# Altium footprint library Display.PcbLib: 9 footprints
Each footprint in its own frame and in the unit in brackets; x right, y up, seen from the top. Pads: shape width x height; smd on the part's side, far side on the other; paste and mask are expansions set on the pad; w line width, h text height; cw(c..) or ccw(c..) is an arc to the next point about the centre after c.
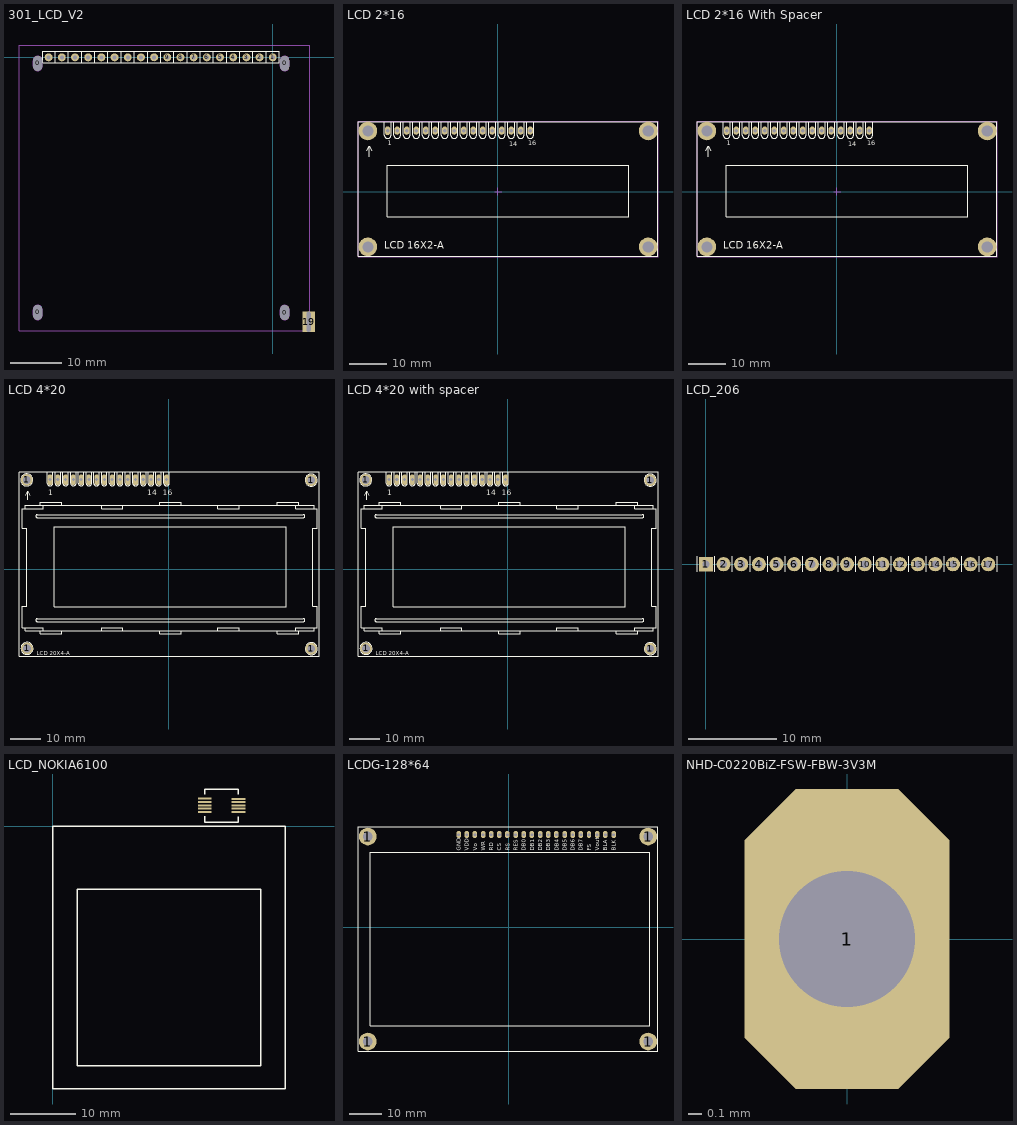
[diagram p0: the footprints below, top view; thin cyan lines are the x and y axes]

## 301_LCD_V2 [mil]
pads (23):
  oval 66.93x110.24 hole 66.93 slot 110.24 at 90 deg unplated: 0(-1781.37,-1933.04) 0(-1781.37,-46.33) 0(89.89,-46.43) 0(90.09,-1933.83)
  round 60 hole 30: 1(0,0) 2(-100.01,0) 3(-199.53,0) 4(-299.54,0) 5(-399.55,0) 6(-499.57,0) 7(-599.58,0) 8(-699.1,0) 9(-799.11,0) 10(-899.22,0.1) 11(-999.07,-0.17) 12(-1098.7,0) 13(-1198.7,0) 14(-1298.7,0) 15(-1398.7,0) 16(-1498.7,0) 17(-1598.7,0) 18(-1698.7,0)
  rect 94.49x157.48 hole 31.5 slot 149.61 at 90 deg: 19(271.54,-2004.36)
Top Overlay:
  lines w7.87: -1648.7,-41 -1648.7,44 ; -1548.7,-41 -1548.7,44 ; -1448.7,-41 -1448.7,44 ; -1348.7,-41 -1348.7,44 ; -1248.7,-41 -1248.7,44 ; -1148.7,-41 -1148.7,44 ; -1049.07,-41.17 -1049.07,43.83 ; -949.22,-40.9 -949.22,44.1 ; -849.11,-41 -849.11,44 ; -749.1,-41 -749.1,44 ; -649.58,-41 -649.58,44 ; -549.57,-41 -549.57,44 ; -449.55,-41 -449.55,44 ; -349.54,-41 -349.54,44 ; -249.53,-41 -249.53,44 ; -150.01,-41 -150.01,44 ; -50,-41 -50,44 ; 49,45 -1742,45 -1742,24 -1742,-42 50.52,-42 50.52,45
Bottom Overlay:
  drawing of 154 lines, arcs and shapes, not listed
Mechanical 1:
  circle w7.87: c-1698.71,0 r15
  circle w7.87: c-1598.71,0 r15
  circle w7.87: c-1498.71,0 r15
  circle w7.87: c-1398.71,0 r15
  circle w7.87: c-1298.71,0 r15
  circle w7.87: c-1198.71,0 r15
  circle w7.87: c-1099.08,-0.17 r15
  circle w7.87: c-999.23,0.1 r15
  circle w7.87: c-899.12,0 r15
  circle w7.87: c-799.11,0 r15
  circle w7.87: c-699.59,0 r15
  circle w7.87: c-599.58,0 r15
  circle w7.87: c-499.57,0 r15
  circle w7.87: c-399.55,0 r15
  circle w7.87: c-299.54,0 r15
  circle w7.87: c-200.02,0 r15
  circle w7.87: c-100.01,0 r15
  circle w7.87: c0,0 r15
  lines w7.87: 264,-2071 -1922.95,-2071 ; 281.38,-2004.36 281.38,-1906.38 281.38,90.92 -1922.95,90.92 -1922.95,-2071 ; -1922.95,-2071 -1922.95,-2071 ; -1814.83,-1954.69 ccw(c-1781.37,-1954.69) -1747.9,-1954.69 -1747.9,-1911.39 ccw(c-1781.37,-1911.39) -1814.83,-1911.39 -1814.83,-1954.69 ; -1814.83,-67.98 ccw(c-1781.37,-67.98) -1747.9,-67.98 -1747.9,-24.67 ccw(c-1781.37,-24.67) -1814.83,-24.67 -1814.83,-67.98 ; 56.43,-68.08 ccw(c89.89,-68.08) 123.36,-68.08 123.36,-24.77 ccw(c89.89,-24.77) 56.43,-24.77 56.43,-68.08 ; 56.63,-1955.48 ccw(c90.09,-1955.48) 123.56,-1955.48 123.56,-1912.17 ccw(c90.09,-1912.17) 56.63,-1912.17 56.63,-1955.48 ; 261.7,-2063.41 ccw(c271.54,-2063.41) 281.38,-2063.41 281.38,-1945.3 ccw(c271.54,-1945.3) 261.7,-1945.3 261.7,-2063.41
3D body "LCD.STEP": height 1023.27, standoff -161.38, extent -1922.95,-2071 276.95,90.92

## LCD 2*16 [mm] "LCD 2x16 Alphanumberic"
height 40
pads (20):
  oct 1.5x2.2 hole 1: 1(-29.464,16.3)
  oval 1.5x2.2 hole 1: 2(-26.924,16.3) 3(-24.384,16.3) 4(-21.844,16.3) 5(-19.304,16.3) 6(-16.764,16.3) 7(-14.224,16.3) 8(-11.684,16.3) 9(-9.144,16.3) 10(-6.604,16.3) 11(-4.064,16.3) 12(-1.524,16.3) 13(1.016,16.3) 14(3.556,16.3) 15(6.096,16.3) 16(8.636,16.3)
  round 5 hole 3: ""(-34.756,-14.775) ""(-34.756,16.213) ""(40.174,-14.775) ""(40.174,16.213)
Top Overlay:
  circle w0.2: c40.204,16.213 r1.25
  circle w0.2: c-34.796,16.213 r1.25
  circle w0.2: c40.204,-14.788 r1.25
  circle w0.2: c-34.796,-14.788 r1.25
  lines w0.2: -35.01,10.879 -34.375,12.149 -33.74,10.879 ; -34.375,9.337 -34.375,12.022 ; -30.353,18.669 -30.353,15.113 ccw(c-29.464,15.113) -28.575,15.113 -28.575,18.669 ; -27.813,18.669 -27.813,15.113 ccw(c-26.924,15.113) -26.035,15.113 -26.035,18.669 ; -25.273,18.669 -25.273,15.113 ccw(c-24.384,15.113) -23.495,15.113 -23.495,18.669 ; -22.733,18.669 -22.733,15.113 ccw(c-21.844,15.113) -20.955,15.113 -20.955,18.669 ; -20.193,18.669 -20.193,15.113 ccw(c-19.304,15.113) -18.415,15.113 -18.415,18.669 ; -17.653,18.669 -17.653,15.113 ccw(c-16.764,15.113) -15.875,15.113 -15.875,18.669 ; -15.113,18.669 -15.113,15.113 ccw(c-14.224,15.113) -13.335,15.113 -13.335,18.669 ; -12.573,18.669 -12.573,15.113 ccw(c-11.684,15.113) -10.795,15.113 -10.795,18.669 ; -10.033,18.669 -10.033,15.113 ccw(c-9.144,15.113) -8.255,15.113 -8.255,18.669 ; -7.493,18.669 -7.493,15.113 ccw(c-6.604,15.113) -5.715,15.113 -5.715,18.669 ; -4.953,18.669 -4.953,15.113 ccw(c-4.064,15.113) -3.175,15.113 -3.175,18.669 ; -2.413,18.669 -2.413,15.113 ccw(c-1.524,15.113) -0.635,15.113 -0.635,18.669 ; 0.127,18.669 0.127,15.113 ccw(c1.016,15.113) 1.905,15.113 1.905,18.669 ; 2.667,18.669 2.667,15.113 ccw(c3.556,15.113) 4.445,15.113 4.445,18.669 ; 5.207,18.669 5.207,15.113 ccw(c6.096,15.113) 6.985,15.113 6.985,18.669 ; 7.747,18.669 7.747,15.113 ccw(c8.636,15.113) 9.525,15.113 9.525,18.669 ; -37.296,-17.288 -37.296,18.712 42.704,18.712 42.704,-17.288 -37.296,-17.288 ; -29.546,-6.688 34.954,-6.688 34.954,7.112 -29.546,7.112 -29.546,-6.688
  text "LCD 16X2-A" at -30.438,-15.283 h1.91
  text "16" at 8.128,12.446 h1.27
  text "1" at -29.464,12.446 h1.27
  text "14" at 3.048,12.192 h1.27
Mechanical 15:
  lines w0.15: -0.9,0 1,0 ; 0,-1 0,1 ; -37.4,-17.4 -37.4,18.8 42.8,18.8 42.8,-17.4 -37.4,-17.4
3D body "User Library-LCD-5.STEP": height 12.3, standoff -6, extent -37.35,-17.3 42.65,18.7

## LCD 2*16 With Spacer [mm] "LCD 2x16 Alphanumberic"
height 80
pads (20):
  oct 1.5x2.2 hole 1: 1(-29.464,16.3)
  oval 1.5x2.2 hole 1: 2(-26.924,16.3) 3(-24.384,16.3) 4(-21.844,16.3) 5(-19.304,16.3) 6(-16.764,16.3) 7(-14.224,16.3) 8(-11.684,16.3) 9(-9.144,16.3) 10(-6.604,16.3) 11(-4.064,16.3) 12(-1.524,16.3) 13(1.016,16.3) 14(3.556,16.3) 15(6.096,16.3) 16(8.636,16.3)
  round 5 hole 3: ""(-34.756,-14.775) ""(-34.756,16.213) ""(40.174,-14.775) ""(40.174,16.213)
Top Overlay:
  circle w0.2: c-34.796,-14.788 r1.25
  circle w0.2: c40.204,-14.788 r1.25
  circle w0.2: c-34.796,16.213 r1.25
  circle w0.2: c40.204,16.213 r1.25
  lines w0.2: -35.01,10.879 -34.375,12.149 -33.74,10.879 ; -34.375,9.337 -34.375,12.022 ; -30.353,18.669 -30.353,15.113 ccw(c-29.464,15.113) -28.575,15.113 -28.575,18.669 ; -27.813,18.669 -27.813,15.113 ccw(c-26.924,15.113) -26.035,15.113 -26.035,18.669 ; -25.273,18.669 -25.273,15.113 ccw(c-24.384,15.113) -23.495,15.113 -23.495,18.669 ; -22.733,18.669 -22.733,15.113 ccw(c-21.844,15.113) -20.955,15.113 -20.955,18.669 ; -20.193,18.669 -20.193,15.113 ccw(c-19.304,15.113) -18.415,15.113 -18.415,18.669 ; -17.653,18.669 -17.653,15.113 ccw(c-16.764,15.113) -15.875,15.113 -15.875,18.669 ; -15.113,18.669 -15.113,15.113 ccw(c-14.224,15.113) -13.335,15.113 -13.335,18.669 ; -12.573,18.669 -12.573,15.113 ccw(c-11.684,15.113) -10.795,15.113 -10.795,18.669 ; -10.033,18.669 -10.033,15.113 ccw(c-9.144,15.113) -8.255,15.113 -8.255,18.669 ; -7.493,18.669 -7.493,15.113 ccw(c-6.604,15.113) -5.715,15.113 -5.715,18.669 ; -4.953,18.669 -4.953,15.113 ccw(c-4.064,15.113) -3.175,15.113 -3.175,18.669 ; -2.413,18.669 -2.413,15.113 ccw(c-1.524,15.113) -0.635,15.113 -0.635,18.669 ; 0.127,18.669 0.127,15.113 ccw(c1.016,15.113) 1.905,15.113 1.905,18.669 ; 2.667,18.669 2.667,15.113 ccw(c3.556,15.113) 4.445,15.113 4.445,18.669 ; 5.207,18.669 5.207,15.113 ccw(c6.096,15.113) 6.985,15.113 6.985,18.669 ; 7.747,18.669 7.747,15.113 ccw(c8.636,15.113) 9.525,15.113 9.525,18.669 ; -37.296,-17.288 42.704,-17.288 42.704,18.712 -37.296,18.712 -37.296,-17.288 ; -29.546,-6.688 -29.546,7.112 34.954,7.112 34.954,-6.688 -29.546,-6.688
  text "14" at 3.048,12.192 h1.27
  text "1" at -29.464,12.446 h1.27
  text "16" at 8.128,12.446 h1.27
  text "LCD 16X2-A" at -30.438,-15.283 h1.91
Mechanical 15:
  lines w0.15: -0.9,0 1,0 ; 0,-1 0,1 ; -37.4,-17.4 42.8,-17.4 42.8,18.8 -37.4,18.8 -37.4,-17.4
3D body "spacer_119030050020.stp": height 20.2, standoff 0.2, extent -37.298,-17.711 -32.298,-11.938
3D body "spacer_119030050020.stp": height 20.2, standoff 0.2, extent 37.744,-17.72 42.744,-11.947
3D body "spacer_119030050020.stp": height 20.2, standoff 0.2, extent 37.643,13.293 42.643,19.067
3D body "spacer_119030050020.stp": height 20.2, standoff 0.2, extent -37.287,13.268 -32.287,19.041
3D body "User Library-LCD-5.STEP": height 30.3, standoff 12, extent -37.35,-17.3 42.65,18.7

## LCD 4*20 [mil]
height 787.4
pads (20):
  round 150 hole 100: 1(-1831,1147) 1(-1827,-1022) 1(1831,1144) 1(1833,-1025)
  oct 60x140 hole 40: 1(-1530.5,1150) 2(-1430.5,1150) 3(-1330.5,1150) 4(-1230.5,1150) 5(-1130.5,1150) 6(-1030.5,1150) 7(-930.5,1150) 8(-830.5,1150) 9(-730.5,1150) 10(-630.5,1150) 11(-530.5,1150) 12(-430.5,1150) 13(-330.5,1150) 14(-230.5,1150) 15(-130.5,1150) 16(-30.5,1150)
Top Overlay:
  drawing of 163 lines, arcs and shapes, not listed
  text "LCD 20X4-A" at -1699.69,-1112.2 h50
  text "14" at -280,950 h70
  text "16" at -80,950 h70
  text "1" at -1555,950 h70
3D body "User Library-LCD20_4.STEP": height 437.01, standoff -106.3, extent -1927,-1116.2 1931.27,1246

## LCD 4*20 with spacer [mil]
height 787.4
pads (20):
  round 150 hole 100: 1(-1831,1147) 1(-1827,-1022) 1(1831,1144) 1(1833,-1025)
  oct 60x140 hole 40: 1(-1530.5,1150) 2(-1430.5,1150) 3(-1330.5,1150) 4(-1230.5,1150) 5(-1130.5,1150) 6(-1030.5,1150) 7(-930.5,1150) 8(-830.5,1150) 9(-730.5,1150) 10(-630.5,1150) 11(-530.5,1150) 12(-430.5,1150) 13(-330.5,1150) 14(-230.5,1150) 15(-130.5,1150) 16(-30.5,1150)
Top Overlay:
  drawing of 163 lines, arcs and shapes, not listed
  text "LCD 20X4-A" at -1699.69,-1112.2 h50
  text "14" at -280,950 h70
  text "16" at -80,950 h70
  text "1" at -1555,950 h70
3D body "spacer_119030050020.stp": height 795.28, standoff 7.87, extent -1928.43,1032.7 -1731.57,1260
3D body "spacer_119030050020.stp": height 795.28, standoff 7.87, extent -1924.85,-1135 -1728,-907.7
3D body "spacer_119030050020.stp": height 795.28, standoff 7.87, extent 1733.58,-1136.3 1930.43,-909
3D body "spacer_119030050020.stp": height 795.28, standoff 7.87, extent 1732.15,1028.35 1929,1255.65
3D body "User Library-LCD20_4.STEP": height 1224.41, standoff 681.1, extent -1927,-1116.2 1931.26,1246

## LCD_206 [mm]
pads (17):
  rect 1.6x1.6 hole 0.8: 1(0,0)
  round 1.6 hole 0.8: 2(2,0) 3(4,0) 4(6,0) 5(8,0) 6(10,0) 7(12,0) 8(14,0) 9(16,0) 10(18,0) 11(20,0) 12(22,0) 13(24.023,0) 14(26,0) 15(28,0) 16(30,0) 17(32,0)
Top Overlay:
  lines w0.1: -1.016,-0.864 -1.016,0.914 ; 0.991,-0.864 0.991,0.914 ; 2.997,-0.864 2.997,0.914 ; 5.004,-0.864 5.004,0.914 ; 6.985,-0.864 6.985,0.914 ; 8.992,-0.864 8.992,0.914 ; 10.998,-0.864 10.998,0.914 ; 13.005,-0.864 13.005,0.914 ; 14.986,-0.864 14.986,0.914 ; 16.993,-0.864 16.993,0.914 ; 18.999,-0.864 18.999,0.914 ; 21.006,-0.864 21.006,0.914 ; 22.987,-0.864 22.987,0.914 ; 24.994,-0.864 24.994,0.914 ; 27,-0.864 27,0.914 ; 28.981,-0.864 28.981,0.914 ; 30.988,-0.864 30.988,0.914 ; 32.995,-0.864 32.995,0.914

## LCD_NOKIA6100 [mm]
height 2
pads (10):
  rect 2.1x0.3 smd: 1(23.239,4.179) 2(23.239,3.679) 3(23.239,3.179) 4(23.239,2.679) 5(23.239,2.179) 6(28.373,2.171) 7(28.373,2.671) 8(28.373,3.171) 9(28.373,3.671) 10(28.373,4.171)
Top Overlay:
  lines w0.127: 27.94,-9.652 28.194,-9.652
  lines w0.203: 23.234,0.588 23.234,1.478 ; 23.241,0.584 28.321,0.584 ; 23.241,5.664 28.321,5.664 ; 23.244,4.868 23.244,5.658 ; 28.324,4.868 28.324,5.648 ; 28.334,0.588 28.334,1.458 ; 0,-40.132 35.56,-40.132 35.56,0 0,0 0,-40.132 ; 3.81,-36.576 31.75,-36.576 31.75,-9.652 28.194,-9.652 3.81,-9.652 3.81,-36.576

## LCDG-128*64 [mm]
height 20
pads (24):
  round 5.5 hole 3: 1(-43.942,-35.56) 1(-43.942,28.321) 1(43.434,-35.56) 1(43.434,28.321)
  oct 1.4x2.2 hole 0.9: 1(-15.656,28.89) 2(-13.116,28.89) 3(-10.576,28.89) 4(-8.036,28.89) 5(-5.496,28.89) 6(-2.956,28.89) 7(-0.416,28.89) 8(2.124,28.89) 9(4.664,28.89) 10(7.204,28.89) 11(9.744,28.89) 12(12.284,28.89) 13(14.824,28.89) 14(17.364,28.89) 15(19.904,28.89) 16(22.444,28.89) 17(24.984,28.89) 18(27.524,28.89) 19(30.104,28.89) 20(32.644,28.89)
Top Overlay:
  lines w0.203: -46.99,-38.608 -46.99,31.392 46.482,31.392 46.482,-38.608 -46.99,-38.608 ; -43.157,-30.61 -43.157,23.391 43.843,23.391 43.843,-30.61 -43.157,-30.61
  text "BLK" at 33.258,23.963 h1.2
  text "BLA" at 30.719,23.963 h1.2
  text "Vout" at 28.181,23.963 h1.2
  text "FS" at 25.642,23.963 h1.2
  text "DB7" at 23.104,23.963 h1.2
  text "DB6" at 20.565,23.963 h1.2
  text "DB5" at 18.027,23.963 h1.2
  text "DB4" at 15.488,23.963 h1.2
  text "DB3" at 12.949,23.963 h1.2
  text "DB2" at 10.411,23.963 h1.2
  text "DB1" at 7.872,23.963 h1.2
  text "DB0" at 5.334,23.963 h1.2
  text "RES" at 2.795,23.963 h1.2
  text "RS" at 0.257,23.963 h1.2
  text "CS" at -2.282,23.963 h1.2
  text "RD" at -4.821,23.963 h1.2
  text "WR" at -7.359,23.963 h1.2
  text "Vo" at -9.898,23.963 h1.2
  text "VDD" at -12.436,23.963 h1.2
  text "GND" at -14.975,23.963 h1.2
3D body "User Library-QC12864B.STEP": height 12.5, standoff -5, extent -47.044,-38.556 45.956,31.444

## NHD-C0220BiZ-FSW-FBW-3V3M [mm]
pads (1):
  oct 1.5x2.2 hole 1: 1(0,0)